# Altium footprint library Apalis Evaluation Board.PcbLib: 212 footprints (part 14 of 14)
Each footprint in its own frame and in the unit in brackets; x right, y up, seen from the top. Pads: shape width x height; smd on the part's side, far side on the other; paste and mask are expansions set on the pad; w line width, h text height; cw(c..) or ccw(c..) is an arc to the next point about the centre after c.
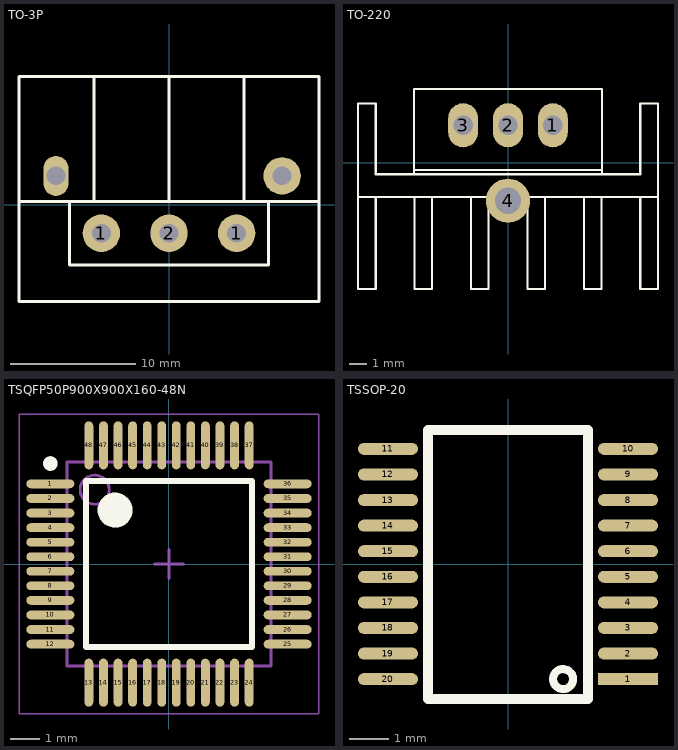
[diagram p13: the footprints below, top view; thin cyan lines are the x and y axes]

## TO-3P [mm]
pads (5):
  round 3 hole 1.5: 1(-5.41,-2.295) 1(5.41,-2.295) 2(0,-2.295) ""(9.05,2.295)
  oval 2x3.2 hole 1.5: ""(-9.05,2.295)
Top Overlay:
  lines w0.254: -12,0.245 -9,0.245 -7.95,0.245 ; -6,0.245 -6,10.235 ; 0,0.245 0,10.235 ; 6,0.245 6,10.225 ; 12,0.245 8.99,0.245 7.95,0.245 ; -7.95,0.245 -7.95,-2.295 -7.95,-4.835 7.95,-4.835 7.95,0.245 ; -7.95,0.245 7.95,0.245 ; -12,-7.753 -12,-4.755 -12,6.235 -12,10.243 -11.998,10.245 -8.99,10.245 9,10.245 11.998,10.245 12,10.243 12,6.245 12,-4.755 12,-7.753 11.998,-7.755 9,-7.755 -9,-7.755 -11.998,-7.755 -12,-7.753

## TO-220 [mm]
pads (4):
  oval 1.7x2.5 hole 1.1: 1(2.54,2.135) 2(0,2.135) 3(-2.54,2.135)
  round 2.5 hole 1.5: 4(0,-2.135)
Top Overlay:
  lines w0.127: -8.5,-1.935 8.5,-1.935 ; -7.5,-1.935 -7.5,-7.135 -8.5,-7.135 -8.5,3.365 -7.5,3.365 -7.5,-0.635 7.5,-0.635 7.5,3.365 8.5,3.365 8.5,-7.135 7.5,-7.135 7.5,-1.935 ; -5.33,-0.405 5.33,-0.405 ; -5.3,-1.935 -5.3,-7.135 -4.3,-7.135 -4.3,-1.935 ; -2.1,-1.935 -2.1,-7.135 ; -1.1,-4.465 -1.1,-1.935 ; -1.1,-3.935 -1.1,-7.135 ; 1.1,-1.935 1.1,-4.465 1.1,-7.135 ; 2.1,-1.935 2.1,-7.135 ; 4.3,-1.935 4.3,-7.135 5.3,-7.135 5.3,-1.935 ; -2.1,-7.135 -1.1,-7.135 ; -2.1,-7.135 -1.1,-7.135 ; 1.1,-7.135 2.1,-7.135 ; 1.1,-7.135 2.1,-7.135 ; -5.33,-0.635 -5.33,4.185 5.33,4.185 5.33,-0.635 -5.33,-0.635

## TSQFP50P900X900X160-48N [mm]
pads (48):
  oval 1.65x0.3 smd: 1(-4.075,2.75) 2(-4.075,2.25) 3(-4.075,1.75) 4(-4.075,1.25) 5(-4.075,0.75) 6(-4.075,0.25) 7(-4.075,-0.25) 8(-4.075,-0.75) 9(-4.075,-1.25) 10(-4.075,-1.75) 11(-4.075,-2.25) 12(-4.075,-2.75) 25(4.075,-2.75) 26(4.075,-2.25) 27(4.075,-1.75) 28(4.075,-1.25) 29(4.075,-0.75) 30(4.075,-0.25) 31(4.075,0.25) 32(4.075,0.75) 33(4.075,1.25) 34(4.075,1.75) 35(4.075,2.25) 36(4.075,2.75)
  oval 0.3x1.65 smd: 13(-2.75,-4.075) 14(-2.25,-4.075) 15(-1.75,-4.075) 16(-1.25,-4.075) 17(-0.75,-4.075) 18(-0.25,-4.075) 19(0.25,-4.075) 20(0.75,-4.075) 21(1.25,-4.075) 22(1.75,-4.075) 23(2.25,-4.075) 24(2.75,-4.075) 37(2.75,4.075) 38(2.25,4.075) 39(1.75,4.075) 40(1.25,4.075) 41(0.75,4.075) 42(0.25,4.075) 43(-0.25,4.075) 44(-0.75,4.075) 45(-1.25,4.075) 46(-1.75,4.075) 47(-2.25,4.075) 48(-2.75,4.075)
Top Overlay:
  circle w0.6: c-1.85,1.85 r0.3
  circle w0.25: c-4.075,3.45 r0.125
  lines w0.2: -2.85,-2.85 2.85,-2.85 2.85,2.85 -2.85,2.85 -2.85,-2.85
Mechanical 1:
  lines w0.05: -5.15,-5.15 5.15,-5.15 5.15,5.15 -5.15,5.15 -5.15,-5.15
Mechanical 2:
  lines w0.01: -3.5,-3.5 -3.5,3.5 3.5,3.5 3.5,-3.5 -3.5,-3.5
Mechanical 3:
  circle w0.1: c-2.55,2.55 r0.5
  lines w0.1: -0.5,0 0.5,0 ; 0,-0.5 0,0.5 ; -3.5,-3.5 -3.5,3.5 3.5,3.5 3.5,-3.5 -3.5,-3.5
3D body: height 1.6, standoff 0.25, extent -3.5,-3.5 3.5,3.5

## TSSOP-20 [mm]
pads (20):
  rect 1.524x0.305 smd: 1(3.05,-2.925)
  oval 1.524x0.305 smd: 2(3.05,-2.275) 3(3.05,-1.625) 4(3.05,-0.975) 5(3.05,-0.325) 6(3.05,0.325) 7(3.05,0.975) 8(3.05,1.625) 9(3.05,2.275) 10(3.05,2.925) 11(-3.05,2.925) 12(-3.05,2.275) 13(-3.05,1.625) 14(-3.05,0.975) 15(-3.05,0.325) 16(-3.05,-0.325) 17(-3.05,-0.975) 18(-3.05,-1.625) 19(-3.05,-2.275) 20(-3.05,-2.925)
Top Overlay:
  circle w0.203: c1.399,-2.925 r0.254
  lines w0.254: -2.03,-3.433 -2.03,3.4 2.034,3.4 2.034,-3.433 -2.03,-3.433
3D body "User Library-TSSOP-20-2.STEP": height 1.2, standoff 0, extent -3.073,-3.224 3.327,3.276